# Altium footprint library HamedLib.PcbLib: 221 footprints (part 1 of 14)
Each footprint in its own frame and in the unit in brackets; x right, y up, seen from the top. Pads: shape width x height; smd on the part's side, far side on the other; paste and mask are expansions set on the pad; w line width, h text height; cw(c..) or ccw(c..) is an arc to the next point about the centre after c.
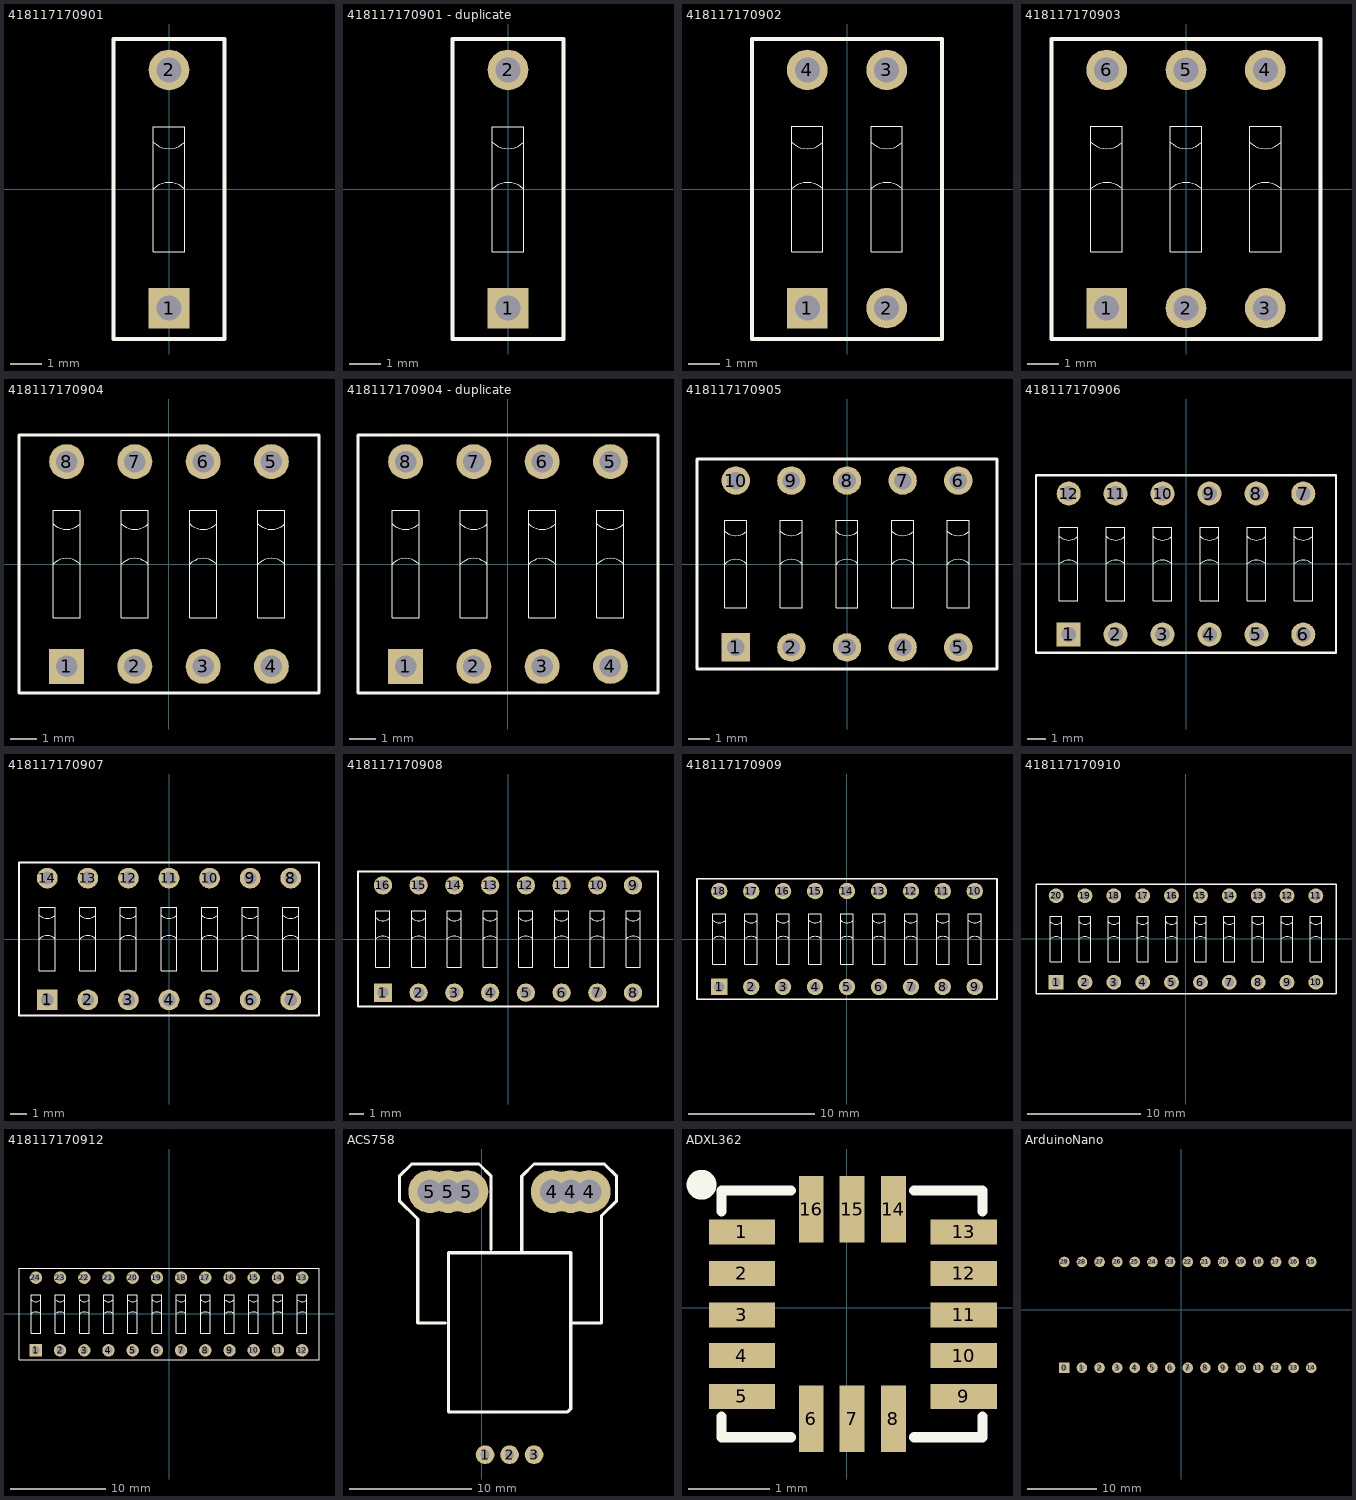
[diagram p0: the footprints below, top view; thin cyan lines are the x and y axes]

## 418117170901 [mm] "01p, 2.54mm Pitch, Horizontal, Box Type, THT, flat Actuator, red, without Tape, Tube"
height 5.2
pads (2):
  rect 1.3x1.3 hole 0.8: 1(0,-3.81)
  round 1.3 hole 0.8: 2(0,3.81)
Top Overlay:
  lines w0.025: -0.5,0 cw(c0,-0.5) 0.5,0 ; -0.5,1.5 ccw(c0,2) 0.5,1.5 ; -0.5,-2 -0.5,2 0.5,2 0.5,-2 -0.5,-2
  lines w0.127: -1.77,-4.8 1.77,-4.8 ; -1.77,-4.8 -1.77,4.8 ; -1.77,-4.8 1.77,-4.8 ; -1.77,-4.8 -1.77,4.8 ; -1.77,4.8 1.77,4.8 ; -1.77,4.8 1.77,4.8 ; 1.77,-4.8 1.77,4.8 ; 1.77,-4.8 1.77,4.8
3D body "418117170901.stp": height 5.4, standoff -3.8, extent -1.77,-4.8 1.77,4.8

## 418117170901 - duplicate [mm] "01p, 2.54mm Pitch, Horizontal, Box Type, THT, flat Actuator, red, without Tape, Tube"
height 5.2
pads (2):
  rect 1.3x1.3 hole 0.8: 1(0,-3.81)
  round 1.3 hole 0.8: 2(0,3.81)
Top Overlay:
  lines w0.025: -0.5,0 cw(c0,-0.5) 0.5,0 ; -0.5,1.5 ccw(c0,2) 0.5,1.5 ; -0.5,-2 -0.5,2 0.5,2 0.5,-2 -0.5,-2
  lines w0.127: -1.77,-4.8 1.77,-4.8 ; -1.77,-4.8 -1.77,4.8 ; -1.77,-4.8 1.77,-4.8 ; -1.77,-4.8 -1.77,4.8 ; -1.77,4.8 1.77,4.8 ; -1.77,4.8 1.77,4.8 ; 1.77,-4.8 1.77,4.8 ; 1.77,-4.8 1.77,4.8
3D body "418117170901.stp": height 5.4, standoff -3.8, extent -1.77,-4.8 1.77,4.8

## 418117170902 [mm] "02p, 2.54mm Pitch, Horizontal, Box Type, THT, flat Actuator, red, without Tape, Tube"
height 5.2
pads (4):
  rect 1.3x1.3 hole 0.8: 1(-1.27,-3.81)
  round 1.3 hole 0.8: 2(1.27,-3.81) 3(1.27,3.81) 4(-1.27,3.81)
Top Overlay:
  lines w0.025: -1.77,0 cw(c-1.27,-0.5) -0.77,0 ; -1.77,1.5 ccw(c-1.27,2) -0.77,1.5 ; 0.77,0 cw(c1.27,-0.5) 1.77,0 ; 0.77,1.5 ccw(c1.27,2) 1.77,1.5 ; -1.77,-2 -0.77,-2 -0.77,2 -1.77,2 -1.77,-2 ; 0.77,-2 1.77,-2 1.77,2 0.77,2 0.77,-2
  lines w0.127: -3.04,-4.8 -3.04,4.8 ; -3.04,-4.8 3.04,-4.8 ; -3.04,-4.8 -3.04,4.8 ; -3.04,-4.8 3.04,-4.8 ; -3.04,4.8 3.04,4.8 ; -3.04,4.8 3.04,4.8 ; 3.04,-4.8 3.04,4.8 ; 3.04,-4.8 3.04,4.8
3D body "418117170902.stp": height 5.4, standoff -3.8, extent -3.04,-4.7 3.04,4.9

## 418117170903 [mm] "03p, 2.54mm Pitch, Horizontal, Box Type, THT, flat Actuator, red, without Tape, Tube"
height 5.2
pads (6):
  rect 1.3x1.3 hole 0.8: 1(-2.54,-3.81)
  round 1.3 hole 0.8: 2(0,-3.81) 3(2.54,-3.81) 4(2.54,3.81) 5(0,3.81) 6(-2.54,3.81)
Top Overlay:
  lines w0.025: -3.04,0 cw(c-2.54,-0.5) -2.04,0 ; -3.04,1.5 ccw(c-2.54,2) -2.04,1.5 ; -0.5,0 cw(c0,-0.5) 0.5,0 ; -0.5,1.5 ccw(c0,2) 0.5,1.5 ; 2.04,0 cw(c2.54,-0.5) 3.04,0 ; 2.04,1.5 ccw(c2.54,2) 3.04,1.5 ; -3.04,-2 -2.04,-2 -2.04,2 -3.04,2 -3.04,-2 ; -0.5,-2 0.5,-2 0.5,2 -0.5,2 -0.5,-2 ; 2.04,-2 3.04,-2 3.04,2 2.04,2 2.04,-2
  lines w0.127: -4.31,-4.8 -4.31,4.8 ; -4.31,-4.8 4.31,-4.8 ; -4.31,-4.8 -4.31,4.8 ; -4.31,-4.8 4.31,-4.8 ; -4.31,4.8 4.31,4.8 ; -4.31,4.8 4.31,4.8 ; 4.31,-4.8 4.31,4.8 ; 4.31,-4.8 4.31,4.8
3D body "418117170903.stp": height 5.4, standoff -3.8, extent -4.31,-4.8 4.31,4.8

## 418117170904 [mm] "04p, 2.54mm Pitch, Horizontal, Box Type, THT, flat Actuator, red, without Tape, Tube"
height 5.2
pads (8):
  rect 1.3x1.3 hole 0.8: 1(-3.81,-3.81)
  round 1.3 hole 0.8: 2(-1.27,-3.81) 3(1.27,-3.81) 4(3.81,-3.81) 5(3.81,3.81) 6(1.27,3.81) 7(-1.27,3.81) 8(-3.81,3.81)
Top Overlay:
  lines w0.025: -4.31,0 cw(c-3.81,-0.5) -3.31,0 ; -4.31,1.5 ccw(c-3.81,2) -3.31,1.5 ; -1.77,0 cw(c-1.27,-0.5) -0.77,0 ; -1.77,1.5 ccw(c-1.27,2) -0.77,1.5 ; 0.77,0 cw(c1.27,-0.5) 1.77,0 ; 0.77,1.5 ccw(c1.27,2) 1.77,1.5 ; 3.31,0 cw(c3.81,-0.5) 4.31,0 ; 3.31,1.5 ccw(c3.81,2) 4.31,1.5 ; -4.31,-2 -4.31,2 -3.31,2 -3.31,-2 -4.31,-2 ; -1.77,-2 -1.77,2 -0.77,2 -0.77,-2 -1.77,-2 ; 0.77,-2 0.77,2 1.77,2 1.77,-2 0.77,-2 ; 3.31,-2 3.31,2 4.31,2 4.31,-2 3.31,-2
  lines w0.127: -5.58,-4.8 -5.58,4.8 ; -5.58,-4.8 5.58,-4.8 ; -5.58,-4.8 -5.58,4.8 ; -5.58,-4.8 5.58,-4.8 ; -5.58,4.8 5.58,4.8 ; -5.58,4.8 5.58,4.8 ; 5.58,-4.8 5.58,4.8 ; 5.58,-4.8 5.58,4.8
3D body "418117170904.stp": height 5.4, standoff -3.8, extent -5.58,-4.8 5.58,4.8

## 418117170904 - duplicate [mm] "04p, 2.54mm Pitch, Horizontal, Box Type, THT, flat Actuator, red, without Tape, Tube"
height 5.2
pads (8):
  rect 1.3x1.3 hole 0.8: 1(-3.81,-3.81)
  round 1.3 hole 0.8: 2(-1.27,-3.81) 3(1.27,-3.81) 4(3.81,-3.81) 5(3.81,3.81) 6(1.27,3.81) 7(-1.27,3.81) 8(-3.81,3.81)
Top Overlay:
  lines w0.025: -4.31,0 cw(c-3.81,-0.5) -3.31,0 ; -4.31,1.5 ccw(c-3.81,2) -3.31,1.5 ; -1.77,0 cw(c-1.27,-0.5) -0.77,0 ; -1.77,1.5 ccw(c-1.27,2) -0.77,1.5 ; 0.77,0 cw(c1.27,-0.5) 1.77,0 ; 0.77,1.5 ccw(c1.27,2) 1.77,1.5 ; 3.31,0 cw(c3.81,-0.5) 4.31,0 ; 3.31,1.5 ccw(c3.81,2) 4.31,1.5 ; -4.31,-2 -4.31,2 -3.31,2 -3.31,-2 -4.31,-2 ; -1.77,-2 -1.77,2 -0.77,2 -0.77,-2 -1.77,-2 ; 0.77,-2 0.77,2 1.77,2 1.77,-2 0.77,-2 ; 3.31,-2 3.31,2 4.31,2 4.31,-2 3.31,-2
  lines w0.127: -5.58,-4.8 -5.58,4.8 ; -5.58,-4.8 5.58,-4.8 ; -5.58,-4.8 -5.58,4.8 ; -5.58,-4.8 5.58,-4.8 ; -5.58,4.8 5.58,4.8 ; -5.58,4.8 5.58,4.8 ; 5.58,-4.8 5.58,4.8 ; 5.58,-4.8 5.58,4.8
3D body "418117170904.stp": height 5.4, standoff -3.8, extent -5.58,-4.8 5.58,4.8

## 418117170905 [mm] "05p, 2.54mm Pitch, Horizontal, Box Type, THT, flat Actuator, red, without Tape, Tube"
height 5.2
pads (10):
  rect 1.3x1.3 hole 0.8: 1(-5.08,-3.81)
  round 1.3 hole 0.8: 2(-2.54,-3.81) 3(0,-3.81) 4(2.54,-3.81) 5(5.08,-3.81) 6(5.08,3.81) 7(2.54,3.81) 8(0,3.81) 9(-2.54,3.81) 10(-5.08,3.81)
Top Overlay:
  lines w0.025: -5.58,0 cw(c-5.08,-0.5) -4.58,0 ; -5.58,1.5 ccw(c-5.08,2) -4.58,1.5 ; -3.04,0 cw(c-2.54,-0.5) -2.04,0 ; -3.04,1.5 ccw(c-2.54,2) -2.04,1.5 ; -0.5,0 cw(c0,-0.5) 0.5,0 ; -0.5,1.5 ccw(c0,2) 0.5,1.5 ; 2.04,0 cw(c2.54,-0.5) 3.04,0 ; 2.04,1.5 ccw(c2.54,2) 3.04,1.5 ; 4.58,0 cw(c5.08,-0.5) 5.58,0 ; 4.58,1.5 ccw(c5.08,2) 5.58,1.5 ; -5.58,-2 -5.58,2 -4.58,2 -4.58,-2 -5.58,-2 ; -3.04,-2 -3.04,2 -2.04,2 -2.04,-2 -3.04,-2 ; -0.5,-2 -0.5,2 0.5,2 0.5,-2 -0.5,-2 ; 2.04,-2 2.04,2 3.04,2 3.04,-2 2.04,-2 ; 4.58,-2 4.58,2 5.58,2 5.58,-2 4.58,-2
  lines w0.127: -6.85,-4.8 -6.85,4.8 ; -6.85,-4.8 6.85,-4.8 ; -6.85,-4.8 -6.85,4.8 ; -6.85,-4.8 6.85,-4.8 ; -6.85,4.8 6.85,4.8 ; -6.85,4.8 6.85,4.8 ; 6.85,-4.8 6.85,4.8 ; 6.85,-4.8 6.85,4.8
3D body "418117170905.stp": height 5.4, standoff -3.8, extent -6.85,-4.8 6.85,4.8

## 418117170906 [mm] "06p, 2.54mm Pitch, Horizontal, Box Type, THT, flat Actuator, red, without Tape, Tube"
height 5.2
pads (12):
  rect 1.3x1.3 hole 0.8: 1(-6.35,-3.81)
  round 1.3 hole 0.8: 2(-3.81,-3.81) 3(-1.27,-3.81) 4(1.27,-3.81) 5(3.81,-3.81) 6(6.35,-3.81) 7(6.35,3.81) 8(3.81,3.81) 9(1.27,3.81) 10(-1.27,3.81) 11(-3.81,3.81) 12(-6.35,3.81)
Top Overlay:
  lines w0.025: -6.85,0 cw(c-6.35,-0.5) -5.85,0 ; -6.85,1.5 ccw(c-6.35,2) -5.85,1.5 ; -4.31,0 cw(c-3.81,-0.5) -3.31,0 ; -4.31,1.5 ccw(c-3.81,2) -3.31,1.5 ; -1.77,0 cw(c-1.27,-0.5) -0.77,0 ; -1.77,1.5 ccw(c-1.27,2) -0.77,1.5 ; 0.77,0 cw(c1.27,-0.5) 1.77,0 ; 0.77,1.5 ccw(c1.27,2) 1.77,1.5 ; 3.31,0 cw(c3.81,-0.5) 4.31,0 ; 3.31,1.5 ccw(c3.81,2) 4.31,1.5 ; 5.85,0 cw(c6.35,-0.5) 6.85,0 ; 5.85,1.5 ccw(c6.35,2) 6.85,1.5 ; -6.85,-2 -6.85,2 -5.85,2 -5.85,-2 -6.85,-2 ; -4.31,-2 -4.31,2 -3.31,2 -3.31,-2 -4.31,-2 ; -1.77,-2 -1.77,2 -0.77,2 -0.77,-2 -1.77,-2 ; 0.77,-2 0.77,2 1.77,2 1.77,-2 0.77,-2 ; 3.31,-2 3.31,2 4.31,2 4.31,-2 3.31,-2 ; 5.85,-2 5.85,2 6.85,2 6.85,-2 5.85,-2
  lines w0.127: -8.12,-4.8 -8.12,4.8 ; -8.12,-4.8 8.12,-4.8 ; -8.12,-4.8 -8.12,4.8 ; -8.12,-4.8 8.12,-4.8 ; -8.12,4.8 8.12,4.8 ; -8.12,4.8 8.12,4.8 ; 8.12,-4.8 8.12,4.8 ; 8.12,-4.8 8.12,4.8
3D body "418117170906.stp": height 5.4, standoff -3.8, extent -8.12,-4.8 8.12,4.8

## 418117170907 [mm] "07p, 2.54mm Pitch, Horizontal, Box Type, THT, flat Actuator, red, without Tape, Tube"
height 5.2
pads (14):
  rect 1.3x1.3 hole 0.8: 1(-7.62,-3.81)
  round 1.3 hole 0.8: 2(-5.08,-3.81) 3(-2.54,-3.81) 4(0,-3.81) 5(2.54,-3.81) 6(5.08,-3.81) 7(7.62,-3.81) 8(7.62,3.81) 9(5.08,3.81) 10(2.54,3.81) 11(0,3.81) 12(-2.54,3.81) 13(-5.08,3.81) 14(-7.62,3.81)
Top Overlay:
  lines w0.025: -8.12,0 cw(c-7.62,-0.5) -7.12,0 ; -8.12,1.5 ccw(c-7.62,2) -7.12,1.5 ; -5.58,0 cw(c-5.08,-0.5) -4.58,0 ; -5.58,1.5 ccw(c-5.08,2) -4.58,1.5 ; -3.04,0 cw(c-2.54,-0.5) -2.04,0 ; -3.04,1.5 ccw(c-2.54,2) -2.04,1.5 ; -0.5,0 cw(c0,-0.5) 0.5,0 ; -0.5,1.5 ccw(c0,2) 0.5,1.5 ; 2.04,0 cw(c2.54,-0.5) 3.04,0 ; 2.04,1.5 ccw(c2.54,2) 3.04,1.5 ; 4.58,0 cw(c5.08,-0.5) 5.58,0 ; 4.58,1.5 ccw(c5.08,2) 5.58,1.5 ; 7.12,0 cw(c7.62,-0.5) 8.12,0 ; 7.12,1.5 ccw(c7.62,2) 8.12,1.5 ; -8.12,-2 -8.12,2 -7.12,2 -7.12,-2 -8.12,-2 ; -5.58,-2 -5.58,2 -4.58,2 -4.58,-2 -5.58,-2 ; -3.04,-2 -3.04,2 -2.04,2 -2.04,-2 -3.04,-2 ; -0.5,-2 -0.5,2 0.5,2 0.5,-2 -0.5,-2 ; 2.04,-2 2.04,2 3.04,2 3.04,-2 2.04,-2 ; 4.58,-2 4.58,2 5.58,2 5.58,-2 4.58,-2 ; 7.12,-2 7.12,2 8.12,2 8.12,-2 7.12,-2
  lines w0.127: -9.39,-4.8 -9.39,4.8 ; -9.39,-4.8 9.39,-4.8 ; -9.39,-4.8 -9.39,4.8 ; -9.39,-4.8 9.39,-4.8 ; -9.39,4.8 9.39,4.8 ; -9.39,4.8 9.39,4.8 ; 9.39,-4.8 9.39,4.8 ; 9.39,-4.8 9.39,4.8
3D body "418117170907.stp": height 5.4, standoff -3.8, extent -9.39,-4.8 9.39,4.8

## 418117170908 [mm] "08p, 2.54mm Pitch, Horizontal, Box Type, THT, flat Actuator, red, without Tape, Tube"
height 5.2
pads (16):
  rect 1.3x1.3 hole 0.8: 1(-8.89,-3.81)
  round 1.3 hole 0.8: 2(-6.35,-3.81) 3(-3.81,-3.81) 4(-1.27,-3.81) 5(1.27,-3.81) 6(3.81,-3.81) 7(6.35,-3.81) 8(8.89,-3.81) 9(8.89,3.81) 10(6.35,3.81) 11(3.81,3.81) 12(1.27,3.81) 13(-1.27,3.81) 14(-3.81,3.81) 15(-6.35,3.81) 16(-8.89,3.81)
Top Overlay:
  lines w0.025: -9.39,0 cw(c-8.89,-0.5) -8.39,0 ; -9.39,1.5 ccw(c-8.89,2) -8.39,1.5 ; -6.85,0 cw(c-6.35,-0.5) -5.85,0 ; -6.85,1.5 ccw(c-6.35,2) -5.85,1.5 ; -4.31,0 cw(c-3.81,-0.5) -3.31,0 ; -4.31,1.5 ccw(c-3.81,2) -3.31,1.5 ; -1.77,0 cw(c-1.27,-0.5) -0.77,0 ; -1.77,1.5 ccw(c-1.27,2) -0.77,1.5 ; 0.77,0 cw(c1.27,-0.5) 1.77,0 ; 0.77,1.5 ccw(c1.27,2) 1.77,1.5 ; 3.31,0 cw(c3.81,-0.5) 4.31,0 ; 3.31,1.5 ccw(c3.81,2) 4.31,1.5 ; 5.85,0 cw(c6.35,-0.5) 6.85,0 ; 5.85,1.5 ccw(c6.35,2) 6.85,1.5 ; 8.39,0 cw(c8.89,-0.5) 9.39,0 ; 8.39,1.5 ccw(c8.89,2) 9.39,1.5 ; -6.85,2 -5.85,2 ; -6.85,2 -6.85,-2 -5.85,-2 -5.85,2 ; -6.85,2 -5.85,2 ; -4.31,2 -3.31,2 ; -4.31,2 -4.31,-2 -3.31,-2 -3.31,2 ; -4.31,2 -3.31,2 ; -1.77,2 -0.77,2 ; -1.77,2 -1.77,-2 -0.77,-2 -0.77,2 ; -1.77,2 -0.77,2 ; -9.39,-2 -9.39,2 -8.39,2 -8.39,-2 -9.39,-2 ; 0.77,-2 0.77,2 1.77,2 1.77,-2 0.77,-2 ; 3.31,-2 3.31,2 4.31,2 4.31,-2 3.31,-2 ; 5.85,-2 5.85,2 6.85,2 6.85,-2 5.85,-2 ; 8.39,-2 8.39,2 9.39,2 9.39,-2 8.39,-2
  lines w0.127: -10.66,-4.8 10.66,-4.8 ; -10.66,-4.8 -10.66,4.8 ; -10.66,-4.8 10.66,-4.8 ; -10.66,-4.8 -10.66,4.8 ; -10.66,4.8 10.66,4.8 ; -10.66,4.8 10.66,4.8 ; 10.66,-4.8 10.66,4.8 ; 10.66,-4.8 10.66,4.8
3D body "418117170908.stp": height 5.4, standoff -3.8, extent -10.66,-4.8 10.66,4.8

## 418117170909 [mm] "09p, 2.54mm Pitch, Horizontal, Box Type, THT, flat Actuator, red, without Tape, Tube"
height 5.2
pads (18):
  rect 1.3x1.3 hole 0.8: 1(-10.16,-3.81)
  round 1.3 hole 0.8: 2(-7.62,-3.81) 3(-5.08,-3.81) 4(-2.54,-3.81) 5(0,-3.81) 6(2.54,-3.81) 7(5.08,-3.81) 8(7.62,-3.81) 9(10.16,-3.81) 10(10.16,3.81) 11(7.62,3.81) 12(5.08,3.81) 13(2.54,3.81) 14(0,3.81) 15(-2.54,3.81) 16(-5.08,3.81) 17(-7.62,3.81) 18(-10.16,3.81)
Top Overlay:
  lines w0.025: -10.66,0 cw(c-10.16,-0.5) -9.66,0 ; -10.66,1.5 ccw(c-10.16,2) -9.66,1.5 ; -8.12,0 cw(c-7.62,-0.5) -7.12,0 ; -8.12,1.5 ccw(c-7.62,2) -7.12,1.5 ; -5.58,0 cw(c-5.08,-0.5) -4.58,0 ; -5.58,1.5 ccw(c-5.08,2) -4.58,1.5 ; -3.04,0 cw(c-2.54,-0.5) -2.04,0 ; -3.04,1.5 ccw(c-2.54,2) -2.04,1.5 ; -0.5,0 cw(c0,-0.5) 0.5,0 ; -0.5,1.5 ccw(c0,2) 0.5,1.5 ; 2.04,0 cw(c2.54,-0.5) 3.04,0 ; 2.04,1.5 ccw(c2.54,2) 3.04,1.5 ; 4.58,0 cw(c5.08,-0.5) 5.58,0 ; 4.58,1.5 ccw(c5.08,2) 5.58,1.5 ; 7.12,0 cw(c7.62,-0.5) 8.12,0 ; 7.12,1.5 ccw(c7.62,2) 8.12,1.5 ; 9.66,0 cw(c10.16,-0.5) 10.66,0 ; 9.66,1.5 ccw(c10.16,2) 10.66,1.5 ; -10.66,-2 -10.66,2 -9.66,2 -9.66,-2 -10.66,-2 ; -8.12,-2 -8.12,2 -7.12,2 -7.12,-2 -8.12,-2 ; -5.58,-2 -5.58,2 -4.58,2 -4.58,-2 -5.58,-2 ; -3.04,-2 -3.04,2 -2.04,2 -2.04,-2 -3.04,-2 ; -0.5,-2 -0.5,2 0.5,2 0.5,-2 -0.5,-2 ; 2.04,-2 2.04,2 3.04,2 3.04,-2 2.04,-2 ; 4.58,-2 4.58,2 5.58,2 5.58,-2 4.58,-2 ; 7.12,-2 7.12,2 8.12,2 8.12,-2 7.12,-2 ; 9.66,-2 9.66,2 10.66,2 10.66,-2 9.66,-2
  lines w0.127: -11.93,-4.8 -11.93,4.8 ; -11.93,-4.8 11.93,-4.8 ; -11.93,-4.8 -11.93,4.8 ; -11.93,-4.8 11.93,-4.8 ; -11.93,4.8 11.93,4.8 ; -11.93,4.8 11.93,4.8 ; 11.93,-4.8 11.93,4.8 ; 11.93,-4.8 11.93,4.8
3D body "418117170909.stp": height 5.4, standoff -3.8, extent -11.93,-4.8 11.93,4.8

## 418117170910 [mm] "10p, 2.54mm Pitch, Horizontal, Box Type, THT, flat Actuator, red, without Tape, Tube"
height 5.2
pads (20):
  rect 1.3x1.3 hole 0.8: 1(-11.43,-3.81)
  round 1.3 hole 0.8: 2(-8.89,-3.81) 3(-6.35,-3.81) 4(-3.81,-3.81) 5(-1.27,-3.81) 6(1.27,-3.81) 7(3.81,-3.81) 8(6.35,-3.81) 9(8.89,-3.81) 10(11.43,-3.81) 11(11.43,3.81) 12(8.89,3.81) 13(6.35,3.81) 14(3.81,3.81) 15(1.27,3.81) 16(-1.27,3.81) 17(-3.81,3.81) 18(-6.35,3.81) 19(-8.89,3.81) 20(-11.43,3.81)
Top Overlay:
  lines w0.025: -11.93,0 cw(c-11.43,-0.5) -10.93,0 ; -11.93,1.5 ccw(c-11.43,2) -10.93,1.5 ; -9.39,0 cw(c-8.89,-0.5) -8.39,0 ; -9.39,1.5 ccw(c-8.89,2) -8.39,1.5 ; -6.85,0 cw(c-6.35,-0.5) -5.85,0 ; -6.85,1.5 ccw(c-6.35,2) -5.85,1.5 ; -4.31,0 cw(c-3.81,-0.5) -3.31,0 ; -4.31,1.5 ccw(c-3.81,2) -3.31,1.5 ; -1.77,0 cw(c-1.27,-0.5) -0.77,0 ; -1.77,1.5 ccw(c-1.27,2) -0.77,1.5 ; 0.77,0 cw(c1.27,-0.5) 1.77,0 ; 0.77,1.5 ccw(c1.27,2) 1.77,1.5 ; 3.31,0 cw(c3.81,-0.5) 4.31,0 ; 3.31,1.5 ccw(c3.81,2) 4.31,1.5 ; 5.85,0 cw(c6.35,-0.5) 6.85,0 ; 5.85,1.5 ccw(c6.35,2) 6.85,1.5 ; 8.39,0 cw(c8.89,-0.5) 9.39,0 ; 8.39,1.5 ccw(c8.89,2) 9.39,1.5 ; 10.93,0 cw(c11.43,-0.5) 11.93,0 ; 10.93,1.5 ccw(c11.43,2) 11.93,1.5 ; -11.93,-2 -11.93,2 -10.93,2 -10.93,-2 -11.93,-2 ; -9.39,-2 -9.39,2 -8.39,2 -8.39,-2 -9.39,-2 ; -6.85,-2 -6.85,2 -5.85,2 -5.85,-2 -6.85,-2 ; -4.31,-2 -4.31,2 -3.31,2 -3.31,-2 -4.31,-2 ; -1.77,-2 -1.77,2 -0.77,2 -0.77,-2 -1.77,-2 ; 0.77,-2 0.77,2 1.77,2 1.77,-2 0.77,-2 ; 3.31,-2 3.31,2 4.31,2 4.31,-2 3.31,-2 ; 5.85,-2 5.85,2 6.85,2 6.85,-2 5.85,-2 ; 8.39,-2 8.39,2 9.39,2 9.39,-2 8.39,-2 ; 10.93,-2 10.93,2 11.93,2 11.93,-2 10.93,-2
  lines w0.127: -13.2,-4.8 -13.2,4.8 ; -13.2,-4.8 13.2,-4.8 ; -13.2,-4.8 -13.2,4.8 ; -13.2,-4.8 13.2,-4.8 ; -13.2,4.8 13.2,4.8 ; -13.2,4.8 13.2,4.8 ; 13.2,-4.8 13.2,4.8 ; 13.2,-4.8 13.2,4.8
3D body "418117170910.stp": height 5.4, standoff -3.8, extent -13.2,-4.8 13.2,4.8

## 418117170912 [mm] "12p, 2.54mm Pitch, Horizontal, Box Type, THT, flat Actuator, red, without Tape, Tube"
height 5.2
pads (24):
  rect 1.3x1.3 hole 0.8: 1(-13.97,-3.81)
  round 1.3 hole 0.8: 2(-11.43,-3.81) 3(-8.89,-3.81) 4(-6.35,-3.81) 5(-3.81,-3.81) 6(-1.27,-3.81) 7(1.27,-3.81) 8(3.81,-3.81) 9(6.35,-3.81) 10(8.89,-3.81) 11(11.43,-3.81) 12(13.97,-3.81) 13(13.97,3.81) 14(11.43,3.81) 15(8.89,3.81) 16(6.35,3.81) 17(3.81,3.81) 18(1.27,3.81) 19(-1.27,3.81) 20(-3.81,3.81) 21(-6.35,3.81) 22(-8.89,3.81) 23(-11.43,3.81) 24(-13.97,3.81)
Top Overlay:
  lines w0.025: -14.47,0 cw(c-13.97,-0.5) -13.47,0 ; -14.47,1.5 ccw(c-13.97,2) -13.47,1.5 ; -11.93,0 cw(c-11.43,-0.5) -10.93,0 ; -11.93,1.5 ccw(c-11.43,2) -10.93,1.5 ; -9.39,0 cw(c-8.89,-0.5) -8.39,0 ; -9.39,1.5 ccw(c-8.89,2) -8.39,1.5 ; -6.85,0 cw(c-6.35,-0.5) -5.85,0 ; -6.85,1.5 ccw(c-6.35,2) -5.85,1.5 ; -4.31,0 cw(c-3.81,-0.5) -3.31,0 ; -4.31,1.5 ccw(c-3.81,2) -3.31,1.5 ; -1.77,0 cw(c-1.27,-0.5) -0.77,0 ; -1.77,1.5 ccw(c-1.27,2) -0.77,1.5 ; 0.77,0 cw(c1.27,-0.5) 1.77,0 ; 0.77,1.5 ccw(c1.27,2) 1.77,1.5 ; 3.31,0 cw(c3.81,-0.5) 4.31,0 ; 3.31,1.5 ccw(c3.81,2) 4.31,1.5 ; 5.85,0 cw(c6.35,-0.5) 6.85,0 ; 5.85,1.5 ccw(c6.35,2) 6.85,1.5 ; 8.39,0 cw(c8.89,-0.5) 9.39,0 ; 8.39,1.5 ccw(c8.89,2) 9.39,1.5 ; 10.93,0 cw(c11.43,-0.5) 11.93,0 ; 10.93,1.5 ccw(c11.43,2) 11.93,1.5 ; 13.47,0 cw(c13.97,-0.5) 14.47,0 ; 13.47,1.5 ccw(c13.97,2) 14.47,1.5 ; -14.47,-2 -13.47,-2 -13.47,2 -14.47,2 -14.47,-2 ; -11.93,-2 -10.93,-2 -10.93,2 -11.93,2 -11.93,-2 ; -9.39,-2 -8.39,-2 -8.39,2 -9.39,2 -9.39,-2 ; -6.85,-2 -5.85,-2 -5.85,2 -6.85,2 -6.85,-2 ; -4.31,-2 -3.31,-2 -3.31,2 -4.31,2 -4.31,-2 ; -1.77,-2 -0.77,-2 -0.77,2 -1.77,2 -1.77,-2 ; 0.77,-2 1.77,-2 1.77,2 0.77,2 0.77,-2 ; 3.31,-2 4.31,-2 4.31,2 3.31,2 3.31,-2 ; 5.85,-2 6.85,-2 6.85,2 5.85,2 5.85,-2 ; 8.39,-2 9.39,-2 9.39,2 8.39,2 8.39,-2 ; 10.93,-2 11.93,-2 11.93,2 10.93,2 10.93,-2 ; 13.47,-2 14.47,-2 14.47,2 13.47,2 13.47,-2
  lines w0.127: -15.74,-4.8 15.74,-4.8 ; -15.74,-4.8 -15.74,4.8 ; -15.74,-4.8 15.74,-4.8 ; -15.74,-4.8 -15.74,4.8 ; -15.74,4.8 15.74,4.8 ; -15.74,4.8 15.74,4.8 ; 15.74,-4.8 15.74,4.8 ; 15.74,-4.8 15.74,4.8
3D body "418117170912.stp": height 5.4, standoff -3.8, extent -15.74,-4.8 15.74,4.8

## ACS758 [mm]
pads (9):
  round 1.524 hole 0.762: 1(0.25,-34.5) 2(2.25,-34.5) 3(4.25,-34.5)
  oval 3.524x3.5 hole 2: 4(5.75,-13) 4(7.25,-13) 4(8.75,-13) 5(-4.25,-13) 5(-2.75,-13) 5(-1.25,-13)
Top Overlay:
  lines w0.254: -5.5,-14 -5.25,-14.25 ; -3,-23.75 -5.25,-23.75 ; 0.75,-17.75 0.75,-11.75 -0.25,-10.75 -5.75,-10.75 -6.75,-11.75 -6.75,-13.75 -5.25,-15.25 -5.25,-23.75 ; 3.25,-18 3.25,-11.75 4.25,-10.75 10,-10.75 11,-11.75 11,-13.75 9.75,-15 9.75,-23.75 7.25,-23.75 ; -5.25,-23.75 -5.25,-23.75 ; -2.75,-31 7,-31 7.25,-30.75 7.25,-18 -2.75,-18 -2.75,-31
3D body "User Library-ACS758xCB-PFF.STEP": height 8.5, standoff -1.98, extent -4.75,-34.66 9.25,-12.25

## ADXL362 [mil]
pads (16):
  rect 32x12 smd paste+0 mask+1: 1(-50.62,36.65) 2(-50.62,16.65) 3(-50.62,-3.35) 4(-50.62,-23.04) 5(-50.62,-42.72) 9(56.53,-42.72) 10(56.53,-23.04) 11(56.53,-3.35) 12(56.53,16.65) 13(56.53,36.65)
  rect 12x32 smd paste+0 mask+1: 6(-17.16,-53.55) 7(2.53,-53.55) 8(22.53,-53.55) 14(22.53,47.65) 15(2.53,47.65) 16(-17.16,47.65)
Top Overlay:
  circle w10: c-70.11,59.44 r2.2
  lines w5: -60.46,-52.57 -60.46,-62.41 -27,-62.41 ; -60.46,46.65 -60.46,56.65 -27,56.65 ; 32.53,-62.41 65.53,-62.41 65.53,-52.57 ; 32.53,56.65 65.53,56.65 65.53,46.65
3D body "LGA16-3x3.step": height 39.76, standoff -0.39, extent -55.11,-62.99 63,55.12

## ArduinoNano [mil]
pads (30):
  rect 60x60 hole 30: 0(-664.45,-329.45)
  round 60 hole 30: 1(-564.45,-329.45) 2(-464.45,-329.45) 3(-364.45,-329.45) 4(-264.45,-329.45) 5(-164.45,-329.45) 6(-64.45,-329.45) 7(35.55,-329.45) 8(135.55,-329.45) 9(235.55,-329.45) 10(335.55,-329.45) 11(435.55,-329.45) 12(535.55,-329.45) 13(635.55,-329.45) 14(735.55,-329.45) 15(735.55,270.55) 16(635.55,270.55) 17(535.55,270.55) 18(435.55,270.55) 19(335.55,270.55) 20(235.55,270.55) 21(135.55,270.55) 22(35.55,270.55) 23(-64.45,270.55) 24(-164.45,270.55) 25(-264.45,270.55) 26(-364.45,270.55) 27(-464.45,270.55) 28(-564.45,270.55) 29(-664.45,270.55)
Top Solder:
  rectangle: -824.45,-389.45 875.55,340.55